# Altium footprint library LDCN Components.PcbLib: 426 footprints (part 5 of 27)
Each footprint in its own frame and in the unit in brackets; x right, y up, seen from the top. Pads: shape width x height; smd on the part's side, far side on the other; paste and mask are expansions set on the pad; w line width, h text height; cw(c..) or ccw(c..) is an arc to the next point about the centre after c.
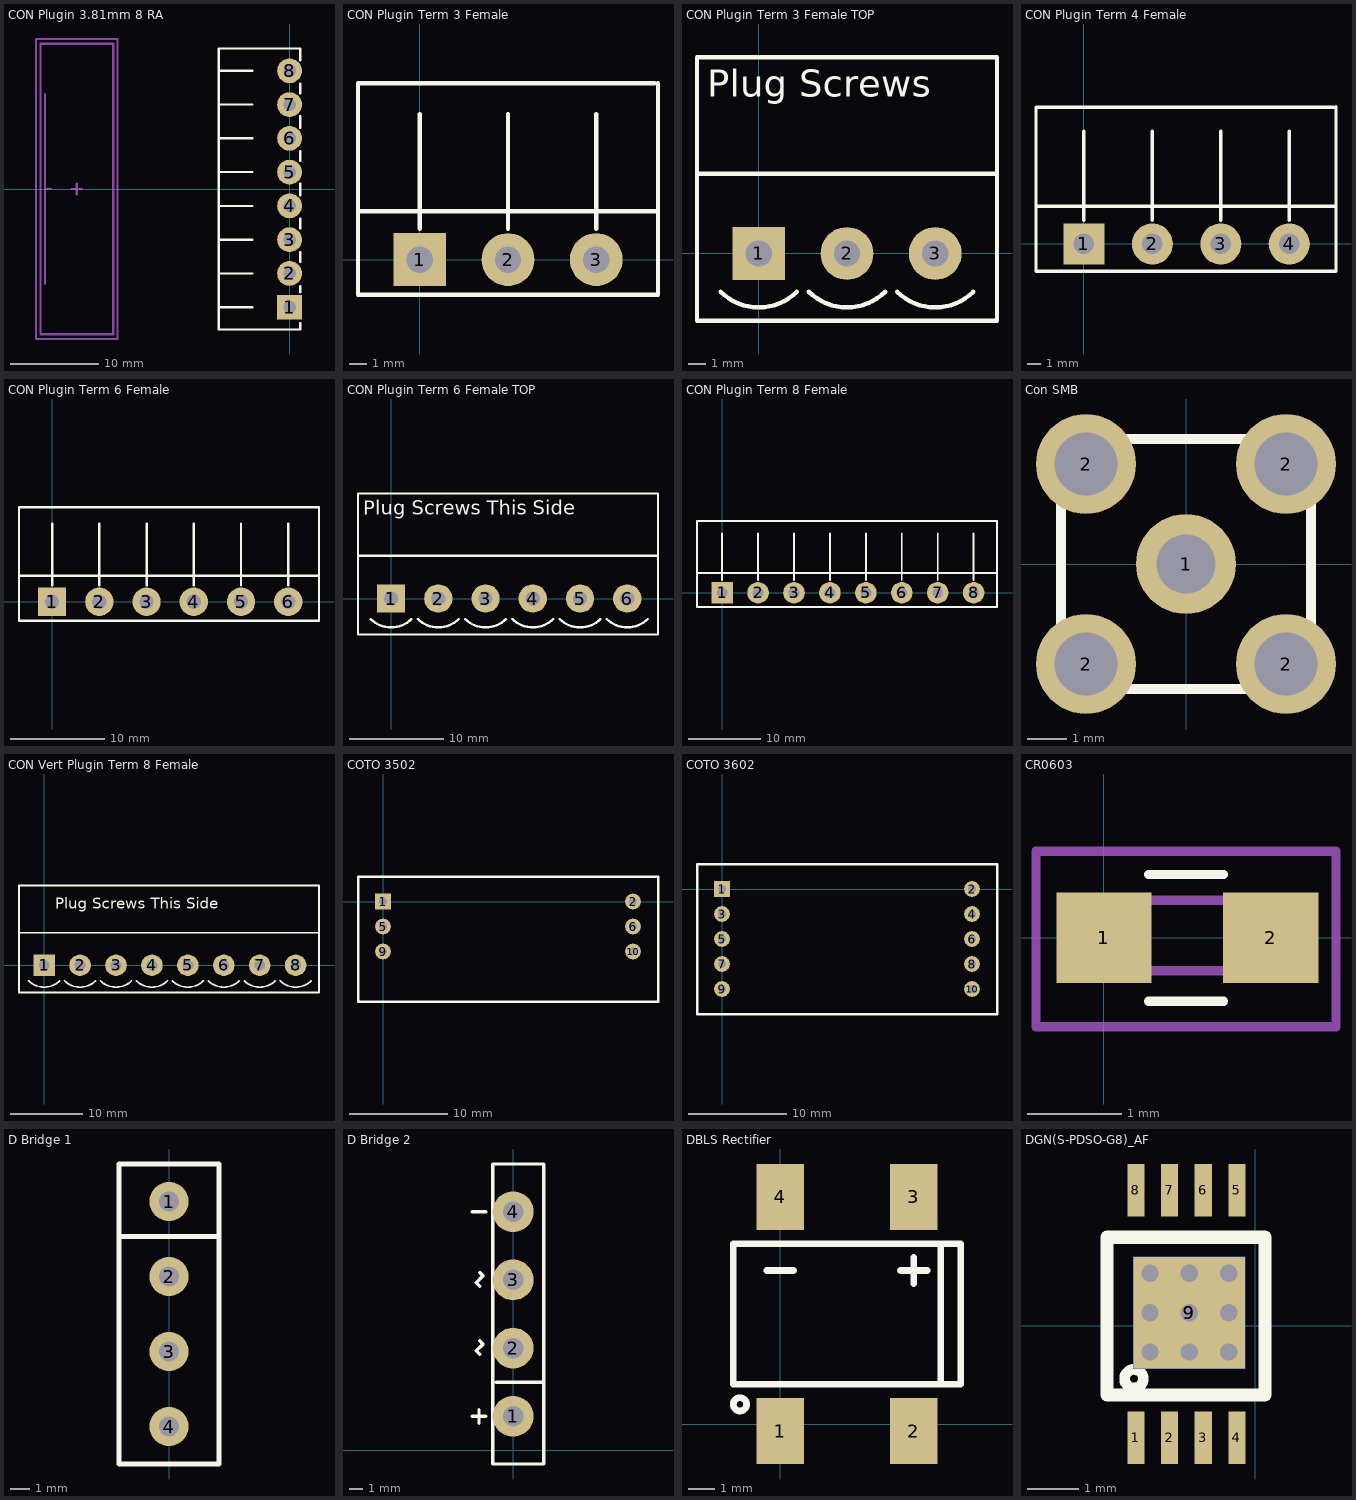
[diagram p4: the footprints below, top view; thin cyan lines are the x and y axes]

## CON Plugin 3.81mm 8 RA [mm] "FCI RA Header"
height 8
pads (8):
  rect 2.8x2.8 hole 1.4: 1(0,-13.335)
  round 2.8 hole 1.4: 2(0,-9.525) 3(0,-5.715) 4(0,-1.905) 5(0,1.905) 6(0,5.715) 7(0,9.525) 8(0,13.335)
Top Overlay:
  lines w0.254: -8,-13.335 -4.2,-13.335 ; -8,-9.525 -4.2,-9.525 ; -8,-5.715 -4.2,-5.715 ; -8,-1.905 -4.2,-1.905 ; -8,1.905 -4.2,1.905 ; -8,5.715 -4.2,5.715 ; -8,9.525 -4.2,9.525 ; -8,13.335 -4.2,13.335 ; 1.2,-15.135 1.2,-15.835 -8,-15.835 -8,15.835 1.2,15.835 1.2,14.505 ; 1.2,-11.635 1.2,-10.935 ; 1.2,-8.235 1.2,-7.135 ; 1.2,-4.435 1.2,-3.335 ; 1.2,-0.735 1.2,0.595 ; 1.2,3.185 1.2,4.285 ; 1.2,6.885 1.2,8.215 ; 1.2,10.805 1.2,11.905
Mechanical 21:
  lines w0.254: -28.1,-16.37 -28.1,16.37 -19.9,16.37 -19.9,-16.37 -28.1,-16.37
Mechanical 22:
  lines w0.254: -27.6,-10.7 -27.6,10.7 ; -27.6,0 -26.9,0 ; -24.6,0 -23.4,0 ; -24,-0.6 -24,0.6
Mechanical 25:
  lines w0.254: -28.6,-16.92 -19.4,-16.92 -19.4,16.92 -28.6,16.92 -28.6,-16.92

## CON Plugin Term 3 Female [mm]
height 8
pads (3):
  rect 3x3 hole 1.5: 1(0,0)
  round 3 hole 1.5: 2(5,0) 3(10,0)
Top Overlay:
  lines w0.254: -3.5,2.75 13.4,2.75 ; 0,1.75 0,8.25 ; 5,1.75 5,8.25 ; 10,1.75 10,8.25 ; 13.325,10 -3.5,10 -3.5,-2 13.5,-2 13.5,10

## CON Plugin Term 3 Female TOP [mm]
height 8
pads (3):
  rect 3x3 hole 1.5: 1(0,0)
  round 3 hole 1.5: 2(5,0) 3(10,0)
Top Overlay:
  lines w0.254: -2.163,-2.163 ccw(c0,0) 2.163,-2.163 ; 2.837,-2.163 ccw(c5,0) 7.163,-2.163 ; 7.837,-2.163 ccw(c10,0) 12.163,-2.163 ; 13.5,4.528 -3.5,4.528 ; -3.5,4.528 -3.5,-3.81 13.5,-3.81 13.5,11.12 -3.5,11.12 -3.5,4.528
  text "Plug Screws" at -2.921,8.89 h1.52

## CON Plugin Term 4 Female [mm]
height 8
pads (4):
  rect 3x3 hole 1.5: 1(0,0)
  round 3 hole 1.5: 2(5,0) 3(10,0) 4(15,0)
Top Overlay:
  lines w0.254: -3.5,2.75 18.288,2.75 ; 0,1.75 0,8.25 ; 5,1.75 5,8.25 ; 10,1.75 10,8.25 ; 15,1.75 15,8.25 ; 18.25,10 -3.5,10 -3.5,-2 18.415,-2 ; 18.415,-1.967 18.415,10.033

## CON Plugin Term 6 Female [mm]
height 8
pads (6):
  rect 3x3 hole 1.5: 1(0,0)
  round 3 hole 1.5: 2(5,0) 3(10,0) 4(15,0) 5(20,0) 6(25,0)
Top Overlay:
  lines w0.254: -3.5,2.75 28.25,2.75 ; 0,1.75 0,8.25 ; 5,1.75 5,8.25 ; 10,1.75 10,8.25 ; 15,1.75 15,8.25 ; 20,1.75 20,8.25 ; 25,1.75 25,8.25 ; -3.5,-2 -3.5,10 18.25,10 28.25,10 28.25,-2 -3.5,-2

## CON Plugin Term 6 Female TOP [mm]
height 8
pads (6):
  rect 3x3 hole 1.5: 1(0,0)
  round 3 hole 1.5: 2(5,0) 3(10,0) 4(15,0) 5(20,0) 6(25,0)
Top Overlay:
  lines w0.254: -2.163,-2.163 ccw(c0,0) 2.163,-2.163 ; 2.837,-2.163 ccw(c5,0) 7.163,-2.163 ; 7.837,-2.163 ccw(c10,0) 12.163,-2.163 ; 12.837,-2.163 ccw(c15,0) 17.163,-2.163 ; 17.837,-2.163 ccw(c20,0) 22.163,-2.163 ; 22.837,-2.163 ccw(c25,0) 27.163,-2.163 ; -3.5,4.528 -3.5,11.12 28.25,11.12 28.25,4.528 ; -3.5,4.528 28.25,4.528 ; -3.5,4.528 -3.5,-3.81 28.25,-3.81 28.25,4.528
  text "Plug Screws This Side" at -2.921,8.89 h1.52

## CON Plugin Term 8 Female [mm]
height 8
pads (8):
  rect 3x3 hole 1.5: 1(0,0)
  round 3 hole 1.5: 2(5,0) 3(10,0) 4(15,0) 5(20,0) 6(25,0) 7(30,0) 8(35,0)
Top Overlay:
  lines w0.254: -3.5,2.75 38.25,2.75 ; 0,1.75 0,8.25 ; 5,1.75 5,8.25 ; 10,1.75 10,8.25 ; 15,1.75 15,8.25 ; 20,1.75 20,8.25 ; 25,1.75 25,8.25 ; 30,1.75 30,8.25 ; 35,1.75 35,8.25 ; -3.5,-2 -3.5,10 18.25,10 38.25,10 38.25,-2 -3.5,-2

## Con SMB [mm]
pads (5):
  round 2.54 hole 1.5: 1(0,0)
  round 2.54 hole 1.6: 2(-2.54,-2.54) 2(-2.54,2.54) 2(2.54,-2.54) 2(2.54,2.54)
Top Overlay:
  lines w0.254: -3.175,-3.175 -3.175,3.175 3.175,3.175 3.175,1.905 3.175,-1.905 3.175,-3.175 -3.175,-3.175

## CON Vert Plugin Term 8 Female [mm]
height 8
pads (8):
  rect 3x3 hole 1.5: 1(0,0)
  round 3 hole 1.5: 2(5,0) 3(10,0) 4(15,0) 5(20,0) 6(25,0) 7(30,0) 8(35,0)
Top Overlay:
  lines w0.254: -2.163,-2.163 ccw(c0,0) 2.163,-2.163 ; 2.837,-2.163 ccw(c5,0) 7.163,-2.163 ; 7.837,-2.163 ccw(c10,0) 12.163,-2.163 ; 12.837,-2.163 ccw(c15,0) 17.163,-2.163 ; 17.837,-2.163 ccw(c20,0) 22.163,-2.163 ; 22.837,-2.163 ccw(c25,0) 27.163,-2.163 ; 27.837,-2.163 ccw(c30,0) 32.163,-2.163 ; 32.837,-2.163 ccw(c35,0) 37.163,-2.163 ; -3.5,4.528 -3.5,11.12 38.25,11.12 38.25,4.528 ; -3.5,4.528 38.25,4.528 ; -3.5,4.528 -3.5,-3.81 38.25,-3.81 38.25,4.528
  text "Plug Screws This Side" at 1.524,7.874 h1.52

## COTO 3502 [mm] "Relay"
height 8
pads (6):
  rect 1.6x1.6 hole 0.8: 1(0,0)
  round 1.6 hole 0.8: 2(25.4,0) 5(0,-2.54) 6(25.4,-2.54) 9(0,-5.08) 10(25.4,-5.08)
Top Overlay:
  lines w0.254: -2.54,-10.16 27.94,-10.16 27.94,2.54 -2.54,2.54 -2.54,-10.16

## COTO 3602 [mm] "Relay"
height 8
pads (10):
  rect 1.6x1.6 hole 0.8: 1(0,0)
  round 1.6 hole 0.8: 2(25.4,0) 3(0,-2.54) 4(25.4,-2.54) 5(0,-5.08) 6(25.4,-5.08) 7(0,-7.62) 8(25.4,-7.62) 9(0,-10.16) 10(25.4,-10.16)
Top Overlay:
  lines w0.254: -2.54,-12.7 -2.54,2.54 27.94,2.54 27.94,-12.7 -2.54,-12.7

## CR0603 [mil] "Chip Capacitor, Body 3.2x1.6mm"
height 9.84
pads (2):
  rect 40x38 smd: 1(0,0) 2(70,0)
Top Overlay:
  lines w3.94: 18.7,-26.57 50.2,-26.57 ; 18.7,26.57 50.2,26.57
Mechanical 13:
  lines w3.94: -1.97,-13.78 69.88,-13.78 69.88,15.75 -1.97,15.75 -1.97,-13.78
Mechanical 15:
  lines w3.94: -28.54,-37.4 -28.54,36.42 97.44,36.42 97.44,-37.4 -28.54,-37.4
3D body: height 51.18, standoff 0, extent -10.83,-13.78 79.72,15.75

## D Bridge 1 [mm] "0.15 Pitch"
height 12
pads (4):
  round 2 hole 1: 1(0,15.24) 2(0,11.43) 3(0,7.62) 4(0,3.81)
Top Overlay:
  lines w0.254: -2.54,13.462 2.54,13.462 ; 2.54,15.113 2.54,17.145 ; 2.54,17.145 2.54,1.905 -2.54,1.905 -2.54,17.145 2.54,17.145

## D Bridge 2 [mil] "200mil Pitch"
height 472.44
pads (4):
  round 120 hole 60: 1(0,100) 2(0,300) 3(0,500) 4(0,700)
Top Overlay:
  lines w10: -120,100 -80,100 ; -120,700 -80,700 ; -100,80 -100,120 ; -98.31,281.69 -108.31,291.69 -88.31,311.69 -98.31,321.69 ; -98.31,481.69 -108.31,491.69 -88.31,511.69 -98.31,521.69 ; -50,200 90,200 ; -60,-40 -60,840 90,840 90,-40 -60,-40

## DBLS Rectifier [mm] "Multicomp DBLS Rectifier"
height 2.6
pads (4):
  rect 1.8x2.5 smd: 1(0,-0.254) 2(5.08,-0.254) 3(5.08,8.636) 4(0,8.636)
Top Overlay:
  circle w0.254: c-1.524,0.762 r0.254
  lines w0.254: -0.508,5.842 0.508,5.842 ; 4.572,5.842 5.588,5.842 ; 5.08,5.334 5.08,6.35 ; 6.096,1.524 6.096,6.858 ; -1.778,1.524 -1.778,6.858 6.858,6.858 6.858,1.524 -1.778,1.524

## DGN(S-PDSO-G8)_AF [mil] "DGN(S-PDSO-G8)_AF for THS4021"
pads (19):
  rect 13x40 smd: 1(-90.59,-85) 2(-65,-85) 3(-39.41,-85) 4(-13.82,-85) 5(-13.82,103.07) 6(-39.41,103.07) 7(-65,103.07) 8(-90.59,103.07)
  round 5 hole 13: 9(-80,-20) 9(-80,10) 9(-80,40) 9(-50,-20) 9(-50,10) 9(-50,40) 9(-20,-20) 9(-20,10) 9(-20,40)
  rect 85x85 smd: 9(-50,10)
  rect 85x85 smd far side: 9(-50,10)
Top Overlay:
  circle w8: c-92.07,-40.16 r7.07
  lines w10: -112.5,-52.66 -112.5,67.34 7.5,67.34 7.5,-52.66 -112.5,-52.66